# Altium footprint library ACTION标准库.pcblib: 504 footprints (part 20 of 32)
Each footprint in its own frame and in the unit in brackets; x right, y up, seen from the top. Pads: shape width x height; smd on the part's side, far side on the other; paste and mask are expansions set on the pad; w line width, h text height; cw(c..) or ccw(c..) is an arc to the next point about the centre after c.
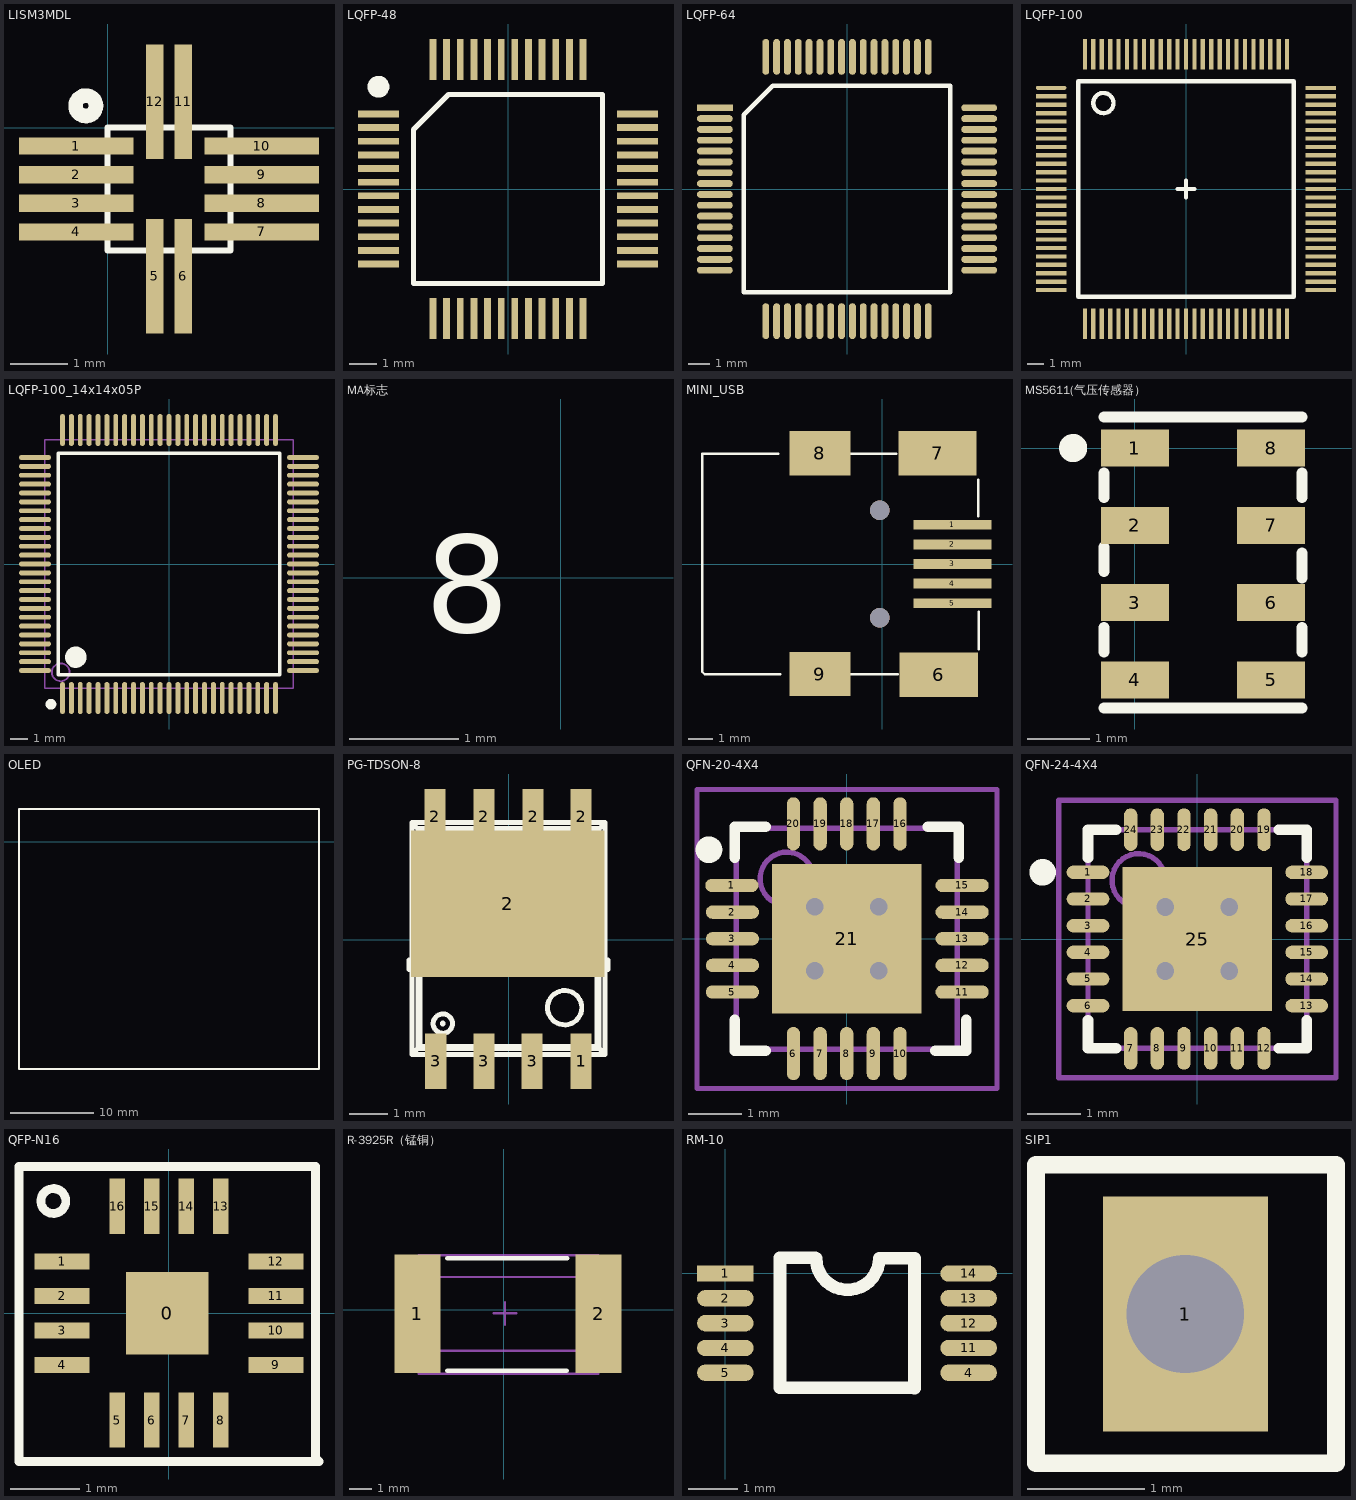
[diagram p19: the footprints below, top view; thin cyan lines are the x and y axes]

## LISM3MDL [mm] "LISM3MDL"
pads (12):
  rect 2x0.3 smd: 1(-0.55,-0.325) 2(-0.55,-0.825) 3(-0.55,-1.325) 4(-0.55,-1.825) 7(2.7,-1.825) 8(2.7,-1.325) 9(2.7,-0.825) 10(2.7,-0.325)
  rect 0.3x2 smd: 5(0.825,-2.6) 6(1.325,-2.6) 11(1.325,0.45) 12(0.825,0.45)
Top Overlay:
  circle w0.254: c-0.381,0.381 r0.18
  lines w0.1: 0,-2.15 2.15,-2.15 2.15,0 0,0 0,-2.15

## LQFP-48 [mm]
pads (48):
  rect 1.5x0.25 smd: 1(-4.75,2.75) 2(-4.75,2.25) 3(-4.75,1.75) 4(-4.75,1.25) 5(-4.75,0.75) 6(-4.75,0.25) 7(-4.75,-0.25) 8(-4.75,-0.75) 9(-4.75,-1.25) 10(-4.75,-1.75) 11(-4.75,-2.25) 12(-4.75,-2.75) 25(4.75,-2.75) 26(4.75,-2.25) 27(4.75,-1.75) 28(4.75,-1.25) 29(4.75,-0.75) 30(4.75,-0.25) 31(4.75,0.25) 32(4.75,0.75) 33(4.75,1.25) 34(4.75,1.75) 35(4.75,2.25) 36(4.75,2.75)
  rect 0.25x1.5 smd: 13(-2.75,-4.75) 14(-2.25,-4.75) 15(-1.75,-4.75) 16(-1.25,-4.75) 17(-0.75,-4.75) 18(-0.25,-4.75) 19(0.25,-4.75) 20(0.75,-4.75) 21(1.25,-4.75) 22(1.75,-4.75) 23(2.25,-4.75) 24(2.75,-4.75) 37(2.75,4.75) 38(2.25,4.75) 39(1.75,4.75) 40(1.25,4.75) 41(0.75,4.75) 42(0.25,4.75) 43(-0.25,4.75) 44(-0.75,4.75) 45(-1.25,4.75) 46(-1.75,4.75) 47(-2.25,4.75) 48(-2.75,4.75)
Top Overlay:
  circle w0.4: c-4.75,3.75 r0.2
  lines w0.2: -3.465,-3.465 3.465,-3.465 3.465,3.465 -2.18,3.465 -3.465,2.18 -3.465,-3.465
3D body "LQFP7X7-48.STEP": height 1.56, standoff 0, extent -4.525,-4.48 4.474,4.52

## LQFP-64 [mm]
pads (64):
  rect 1.651x0.32 smd: 1(-6.1,3.75)
  oval 1.651x0.32 smd: 2(-6.1,3.25) 3(-6.1,2.75) 4(-6.1,2.25) 5(-6.1,1.75) 6(-6.1,1.25) 7(-6.1,0.75) 8(-6.1,0.25) 9(-6.1,-0.25) 10(-6.1,-0.75) 11(-6.1,-1.25) 12(-6.1,-1.75) 13(-6.1,-2.25) 14(-6.1,-2.75) 15(-6.1,-3.25) 16(-6.1,-3.75) 33(6.1,-3.75) 34(6.1,-3.25) 35(6.1,-2.75) 36(6.1,-2.25) 37(6.1,-1.75) 38(6.1,-1.25) 39(6.1,-0.75) 40(6.1,-0.25) 41(6.1,0.25) 42(6.1,0.75) 43(6.1,1.25) 44(6.1,1.75) 45(6.1,2.25) 46(6.1,2.75) 47(6.1,3.25) 48(6.1,3.75)
  oval 0.32x1.651 smd: 17(-3.75,-6.1) 18(-3.25,-6.1) 19(-2.75,-6.1) 20(-2.25,-6.1) 21(-1.75,-6.1) 22(-1.25,-6.1) 23(-0.75,-6.1) 24(-0.25,-6.1) 25(0.25,-6.1) 26(0.75,-6.1) 27(1.25,-6.1) 28(1.75,-6.1) 29(2.25,-6.1) 30(2.75,-6.1) 31(3.25,-6.1) 32(3.75,-6.1) 49(3.75,6.1) 50(3.25,6.1) 51(2.75,6.1) 52(2.25,6.1) 53(1.75,6.1) 54(1.25,6.1) 55(0.75,6.1) 56(0.25,6.1) 57(-0.25,6.1) 58(-0.75,6.1) 59(-1.25,6.1) 60(-1.75,6.1) 61(-2.25,6.1) 62(-2.75,6.1) 63(-3.25,6.1) 64(-3.75,6.1)
Top Overlay:
  lines w0.2: -4.765,-4.765 -4.765,3.43 -3.43,4.765 4.765,4.765 4.765,-4.765 -4.765,-4.765
3D body "LQFP-64.STEP": height 1.6, standoff 0, extent -5.949,-6 6.051,6

## LQFP-100 [mm]
pads (100):
  oval 1.8x0.25 smd: 1(-8,6)
  rect 1.8x0.25 smd: 2(-8,5.5) 3(-8,5) 4(-8,4.5) 5(-8,4) 6(-8,3.5) 7(-8,3) 8(-8,2.5) 9(-8,2) 10(-8,1.5) 11(-8,1) 12(-8,0.5) 13(-8,0) 14(-8,-0.5) 15(-8,-1) 16(-8,-1.5) 17(-8,-2) 18(-8,-2.5) 19(-8,-3) 20(-8,-3.5) 21(-8,-4) 22(-8,-4.5) 23(-8,-5) 24(-8,-5.5) 25(-8,-6) 51(8,-6) 52(8,-5.5) 53(8,-5) 54(8,-4.5) 55(8,-4) 56(8,-3.5) 57(8,-3) 58(8,-2.5) 59(8,-2) 60(8,-1.5) 61(8,-1) 62(8,-0.5) 63(8,0) 64(8,0.5) 65(8,1) 66(8,1.5) 67(8,2) 68(8,2.5) 69(8,3) 70(8,3.5) 71(8,4) 72(8,4.5) 73(8,5) 74(8,5.5) 75(8,6)
  rect 0.25x1.8 smd: 26(-6,-8) 27(-5.5,-8) 28(-5,-8) 29(-4.5,-8) 30(-4,-8) 31(-3.5,-8) 32(-3,-8) 33(-2.5,-8) 34(-2,-8) 35(-1.5,-8) 36(-1,-8) 37(-0.5,-8) 38(0,-8) 39(0.5,-8) 40(1,-8) 41(1.5,-8) 42(2,-8) 43(2.5,-8) 44(3,-8) 45(3.5,-8) 46(4,-8) 47(4.5,-8) 48(5,-8) 49(5.5,-8) 50(6,-8) 76(6,8) 77(5.5,8) 78(5,8) 79(4.5,8) 80(4,8) 81(3.5,8) 82(3,8) 83(2.5,8) 84(2,8) 85(1.5,8) 86(1,8) 87(0.5,8) 88(0,8) 89(-0.5,8) 90(-1,8) 91(-1.5,8) 92(-2,8) 93(-2.5,8) 94(-3,8) 95(-3.5,8) 96(-4,8) 97(-4.5,8) 98(-5,8) 99(-5.5,8) 100(-6,8)
Top Overlay:
  circle w0.254: c-4.9,5.1 r0.6
  lines w0.254: -0.5,0 0.5,0 ; 0,-0.5 0,0.5 ; -6.4,-6.4 -6.4,6.4 6.4,6.4 6.4,-6.4 -6.4,-6.4
3D body "LQFP-100.STEP": height 1.6, standoff 0, extent -7.97,-7.969 8.03,8.031

## LQFP-100_14x14x05P [mm]
pads (100):
  oval 0.28x1.8 smd mask+0.051: 1(-6,-7.55) 2(-5.5,-7.55) 3(-5,-7.55) 4(-4.5,-7.55) 5(-4,-7.55) 6(-3.5,-7.55) 7(-3,-7.55) 8(-2.5,-7.55) 9(-2,-7.55) 10(-1.5,-7.55) 11(-1,-7.55) 12(-0.5,-7.55) 13(0,-7.55) 14(0.5,-7.55) 15(1,-7.55) 16(1.5,-7.55) 17(2,-7.55) 18(2.5,-7.55) 19(3,-7.55) 20(3.5,-7.55) 21(4,-7.55) 22(4.5,-7.55) 23(5,-7.55) 24(5.5,-7.55) 25(6,-7.55) 51(6,7.55) 52(5.5,7.55) 53(5,7.55) 54(4.5,7.55) 55(4,7.55) 56(3.5,7.55) 57(3,7.55) 58(2.5,7.55) 59(2,7.55) 60(1.5,7.55) 61(1,7.55) 62(0.5,7.55) 63(0,7.55) 64(-0.5,7.55) 65(-1,7.55) 66(-1.5,7.55) 67(-2,7.55) 68(-2.5,7.55) 69(-3,7.55) 70(-3.5,7.55) 71(-4,7.55) 72(-4.5,7.55) 73(-5,7.55) 74(-5.5,7.55) 75(-6,7.55)
  oval 1.8x0.28 smd mask+0.051: 26(7.55,-6) 27(7.55,-5.5) 28(7.55,-5) 29(7.55,-4.5) 30(7.55,-4) 31(7.55,-3.5) 32(7.55,-3) 33(7.55,-2.5) 34(7.55,-2) 35(7.55,-1.5) 36(7.55,-1) 37(7.55,-0.5) 38(7.55,0) 39(7.55,0.5) 40(7.55,1) 41(7.55,1.5) 42(7.55,2) 43(7.55,2.5) 44(7.55,3) 45(7.55,3.5) 46(7.55,4) 47(7.55,4.5) 48(7.55,5) 49(7.55,5.5) 50(7.55,6) 76(-7.55,6) 77(-7.55,5.5) 78(-7.55,5) 79(-7.55,4.5) 80(-7.55,4) 81(-7.55,3.5) 82(-7.55,3) 83(-7.55,2.5) 84(-7.55,2) 85(-7.55,1.5) 86(-7.55,1) 87(-7.55,0.5) 88(-7.55,0) 89(-7.55,-0.5) 90(-7.55,-1) 91(-7.55,-1.5) 92(-7.55,-2) 93(-7.55,-2.5) 94(-7.55,-3) 95(-7.55,-3.5) 96(-7.55,-4) 97(-7.55,-4.5) 98(-7.55,-5) 99(-7.55,-5.5) 100(-7.55,-6)
Top Overlay:
  circle w0.3: c-6.65,-7.9 r0.15
  circle w0.6: c-5.25,-5.25 r0.3
  lines w0.2: -6.25,-6.25 6.25,-6.25 6.25,6.25 -6.25,6.25 -6.25,-6.25
Mechanical 13:
  circle w0.1: c-6.1,-6.1 r0.5
  lines w0.1: -7,-7 7,-7 7,7 -7,7 -7,-7
3D body "User Library-LQFP100_Grid_0_5.STEP": height 1.6, standoff 0, extent -8,-8 8,8

## MA标志 [mm]
Top Overlay:
  text "8" at -1.245,-0.787 h1.52

## MINI_USB [mm]
pads (9):
  rect 3.2x0.4 smd: 1(2.871,1.6) 2(2.871,0.8) 3(2.871,0) 4(2.871,-0.8) 5(2.871,-1.6)
  rect 3.2x1.8 smd: 6(2.311,-4.521) 7(2.26,4.521)
  rect 2.5x1.8 smd: 8(-2.54,4.521) 9(-2.54,-4.496)
via -0.104,-2.2 diameter 0.8 hole 0.8
via -0.104,2.2 diameter 0.8 hole 0.8
Top Overlay:
  lines w0.1: -4.839,4.5 -7.339,4.5 -7.339,-4.4 -7.239,-4.5 -4.739,-4.5
  lines w0.102: -4.839,4.5 -4.246,4.5 ; -4.739,-4.5 -4.169,-4.5 -4.165,-4.496 ; -1.6,-4.496 0.636,-4.496 ; -1.574,4.496 0.585,4.496 ; 3.912,1.956 3.912,3.429 ; 3.938,-3.48 3.938,-1.956
3D body "USB_mini_B.STEP": height 3.95, standoff -1, extent -5.976,-5.299 3.224,5.401

## MS5611(气压传感器） [mm]
pads (8):
  rect 1.1x0.6 smd: 1(0,0) 2(0,-1.25) 3(0,-2.5) 4(0,-3.75) 5(2.2,-3.75) 6(2.2,-2.5) 7(2.2,-1.25) 8(2.2,0)
Top Overlay:
  circle w0.254: c-1,0 r0.1
  lines w0.178: -0.5,-4.2 2.7,-4.2 ; -0.5,-3.3 -0.5,-2.9 ; -0.5,-2 -0.5,-1.6 ; -0.5,-0.8 -0.5,-0.4 ; -0.5,0.5 2.7,0.5 ; 2.7,-3.3 2.7,-2.9 ; 2.7,-2.1 2.7,-1.7 ; 2.7,-0.8 2.7,-0.4

## OLED [mm] "Chip Inductor, 2-Leads, Body 11.00x11.00mm, IPC Medium Density"
height 4.1
Top Overlay:
  lines w0.254: 4.191,-27.051 39.929,-27.051 39.929,3.912 4.191,3.912 4.191,-27.048

## PG-TDSON-8 [mm]
pads (9):
  rect 0.55x1.44 smd: 1(1.874,-3.137) 2(-1.911,3.188) 2(-0.641,3.188) 2(0.629,3.188) 2(1.874,3.188) 3(-1.885,-3.137) 3(-0.641,-3.137) 3(0.604,-3.137)
  rect 5x3.8 smd: 2(-0.025,0.94)
Top Overlay:
  circle w0.127: c1.448,-1.753 r0.444
  circle w0.127: c-1.706,-2.163 r0.25
  circle w0.127: c-1.706,-2.163 r0.01
  lines w0.127: -2.506,-0.763 -2.506,-2.963 ; -2.506,-0.513 -2.506,3.037 ; -2.036,-2.963 -2.506,-2.963 ; -2.036,3.037 -2.506,3.037 ; -1.786,-2.963 -0.766,-2.963 ; -1.786,3.037 -0.766,3.037 ; -0.516,-2.963 0.504,-2.963 ; -0.516,3.037 0.504,3.037 ; 0.754,-2.963 1.774,-2.963 ; 0.754,3.037 1.774,3.037 ; 2.024,-2.963 2.494,-2.963 ; 2.024,3.037 2.494,3.037 ; 2.494,-0.763 2.494,-2.963 ; 2.494,-0.513 2.494,3.037 ; -2.506,-2.963 -2.351,-2.808 ; -2.506,3.037 -2.351,2.881 ; -2.351,-2.808 -2.301,-2.759 ; -2.351,-2.808 -2.351,2.881 ; -2.351,-2.808 2.339,-2.808 ; -2.351,2.881 -2.301,2.832 ; -2.351,2.881 2.339,2.881 ; -2.301,-2.759 -2.301,2.832 ; -2.301,-2.759 2.29,-2.759 ; -2.301,2.832 2.29,2.832 ; 2.29,-2.759 2.339,-2.808 ; 2.29,-2.759 2.29,2.832 ; 2.29,2.832 2.339,2.881 ; 2.339,-2.808 2.494,-2.963 ; 2.339,-2.808 2.339,2.881 ; 2.339,2.881 2.494,3.037 ; -2.581,-0.763 -2.471,-0.763 -2.471,-0.513 -2.581,-0.513 -2.581,-0.763 ; -2.036,-3.038 -1.786,-3.038 -1.786,-2.929 -2.036,-2.929 -2.036,-3.038 ; -2.036,3.002 -1.786,3.002 -1.786,3.111 -2.036,3.111 -2.036,3.002 ; -0.766,-3.038 -0.516,-3.038 -0.516,-2.929 -0.766,-2.929 -0.766,-3.038 ; -0.766,3.002 -0.516,3.002 -0.516,3.111 -0.766,3.111 -0.766,3.002 ; 0.504,-3.038 0.754,-3.038 0.754,-2.929 0.504,-2.929 0.504,-3.038 ; 0.504,3.002 0.754,3.002 0.754,3.111 0.504,3.111 0.504,3.002 ; 1.774,-3.038 2.024,-3.038 2.024,-2.929 1.774,-2.929 1.774,-3.038 ; 1.774,3.002 2.024,3.002 2.024,3.111 1.774,3.111 1.774,3.002 ; 2.46,-0.763 2.46,-0.513 2.569,-0.513 2.569,-0.763 2.46,-0.763
3D body "User Library-son_1p27-6x5x1p10-5_8n.step": height 1.1, standoff 0, extent -2.575,-3.024 2.575,3.126

## QFN-20-4X4 [mm]
pads (21):
  oval 1x0.25 smd: 1(-2.155,1) 2(-2.145,0.5) 3(-2.145,0) 4(-2.145,-0.5) 5(-2.145,-1) 11(2.165,-1) 12(2.165,-0.5) 13(2.165,0) 14(2.165,0.5) 15(2.165,1)
  oval 0.25x1 smd: 6(-1,-2.155) 7(-0.5,-2.155) 8(0,-2.155) 9(0.5,-2.155) 10(1,-2.155) 16(1,2.155) 17(0.5,2.155) 18(0,2.155) 19(-0.5,2.155) 20(-1,2.155)
  rect 2.8x2.8 smd: 21(0,0)
via 0.6,-0.6 diameter 0.66 hole 0.33
via -0.6,-0.6 diameter 0.66 hole 0.33
via 0.6,0.6 diameter 0.66 hole 0.33
via -0.6,0.6 diameter 0.66 hole 0.33
Top Overlay:
  circle w0.25: c-2.585,1.67 r0.125
  lines w0.2: -2.1,-1.525 -2.1,-2.1 -1.525,-2.1 ; -2.1,1.525 -2.1,2.1 -1.525,2.1 ; 1.525,2.1 2.1,2.1 2.1,1.525 ; 1.665,-2.1 2.24,-2.1 2.24,-1.525
Mechanical 13:
  circle w0.1: c-1.125,1.125 r0.5
  lines w0.1: -2.075,-2.075 2.075,-2.075 2.075,2.075 -2.075,2.075 -2.075,-2.075
Mechanical 15:
  lines w0.1: -0.5,0 0.5,0 ; 0,-0.5 0,0.5 ; -2.81,-2.81 2.82,-2.81 2.82,2.8 -2.81,2.8 -2.81,-2.81
3D body "User Library-QFN20(4x4).STEP": height 0.9, standoff -0.02, extent -2,-2 2,2

## QFN-24-4X4 [mm]
pads (25):
  oval 0.8x0.25 smd: 1(-2.05,1.25) 2(-2.05,0.75) 3(-2.05,0.25) 4(-2.05,-0.25) 5(-2.05,-0.75) 6(-2.05,-1.25) 13(2.05,-1.25) 14(2.05,-0.75) 15(2.05,-0.25) 16(2.05,0.25) 17(2.05,0.75) 18(2.05,1.25)
  oval 0.25x0.8 smd: 7(-1.25,-2.05) 8(-0.75,-2.05) 9(-0.25,-2.05) 10(0.25,-2.05) 11(0.75,-2.05) 12(1.25,-2.05) 19(1.25,2.05) 20(0.75,2.05) 21(0.25,2.05) 22(-0.25,2.05) 23(-0.75,2.05) 24(-1.25,2.05)
  rect 2.8x2.7 smd: 25(0,0)
via -0.6,0.6 diameter 0.66 hole 0.33
via 0.6,0.6 diameter 0.66 hole 0.33
via -0.6,-0.6 diameter 0.66 hole 0.33
via 0.6,-0.6 diameter 0.66 hole 0.33
Top Overlay:
  circle w0.25: c-2.9,1.25 r0.125
  lines w0.2: -2.05,-1.525 -2.05,-2.05 -1.525,-2.05 ; -2.05,1.525 -2.05,2.05 -1.525,2.05 ; 1.525,-2.05 2.05,-2.05 2.05,-1.525 ; 1.525,2.05 2.05,2.05 2.05,1.525
Mechanical 13:
  circle w0.1: c-1.1,1.1 r0.5
  lines w0.1: -2.05,-2.05 -2.05,2.05 2.05,2.05 2.05,-2.05 -2.05,-2.05
Mechanical 15:
  lines w0.1: -0.5,0 0.5,0 ; 0,-0.5 0,0.5 ; -2.6,-2.6 -2.6,2.6 2.6,2.6 2.6,-2.6 -2.6,-2.6
3D body "MLF24.STEP": height 1, standoff 0, extent -2,-1.981 2,2.019

## QFP-N16 [mm]
pads (17):
  rect 1.2x1.2 smd: 0(-0.026,0)
  rect 0.8x0.23 smd: 1(-1.55,0.75) 2(-1.55,0.25) 3(-1.55,-0.25) 4(-1.55,-0.75) 9(1.55,-0.75) 10(1.55,-0.25) 11(1.55,0.25) 12(1.55,0.75)
  rect 0.23x0.8 smd: 5(-0.75,-1.55) 6(-0.25,-1.55) 7(0.25,-1.55) 8(0.75,-1.55) 13(0.75,1.55) 14(0.25,1.55) 15(-0.25,1.55) 16(-0.75,1.55)
Top Overlay:
  circle w0.127: c-1.676,1.626 r0.18
  lines w0.127: -2.175,-2.15 2.175,-2.15 2.15,-2.125 2.125,-2.1 2.125,2.125 -2.175,2.125 -2.175,0.925 -2.175,-2.15

## R-3925R（锰铜） [mm]
pads (2):
  rect 2x5.2 smd: 1(-3.785,-0.178) 2(4.14,-0.178)
Top Overlay:
  lines w0.2: -2.489,-2.667 2.743,-2.667 ; -2.489,2.261 2.769,2.261
Mechanical 13:
  lines w0.1: -3.785,-1.788 4.089,-1.788 4.089,1.432 -3.785,1.432 -3.785,-1.788
Mechanical 15:
  lines w0.1: -0.449,-0.152 0.551,-0.152 ; 0.051,-0.66 0.051,0.34 ; -3.734,-2.794 4.14,-2.794 4.14,2.388 -3.734,2.388 -3.734,-2.794
3D body: height 0.38, standoff -0.71, extent -3.518,-2.603 4.432,2.248

## RM-10 [mm]
pads (10):
  rect 1.143x0.33 smd: 1(0,0)
  oval 1.143x0.33 smd: 2(0,-0.5) 3(0,-1) 4(0,-1.5) 4(4.9,-2) 5(0,-2) 11(4.9,-1.5) 12(4.9,-1) 13(4.9,-0.5) 14(4.9,0)
Top Overlay:
  lines w0.254: 1.814,0.32 1.1,0.32 1.1,-2.3 3.799,-2.3 ; 1.829,0.305 ccw(c2.464,0.305) 3.099,0.305 3.806,0.305 ; 3.81,-2.311 3.81,0.309

## SIP1 [mm]
pads (1):
  rect 1.4x2 hole 1: 1(50.8,101.6)
Top Overlay:
  lines w0.15: 52.06,100.33 49.53,100.33 49.53,102.87 52.07,102.87 ; 52.08,100.33 52.08,102.87
3D body "Samtec-1.step": height 8.89, standoff -2.03, extent 49.525,100.33 52.065,102.87